# Altium footprint library Connectors_Old.PcbLib: 246 footprints (part 7 of 18)
Each footprint in its own frame and in the unit in brackets; x right, y up, seen from the top. Pads: shape width x height; smd on the part's side, far side on the other; paste and mask are expansions set on the pad; w line width, h text height; cw(c..) or ccw(c..) is an arc to the next point about the centre after c.
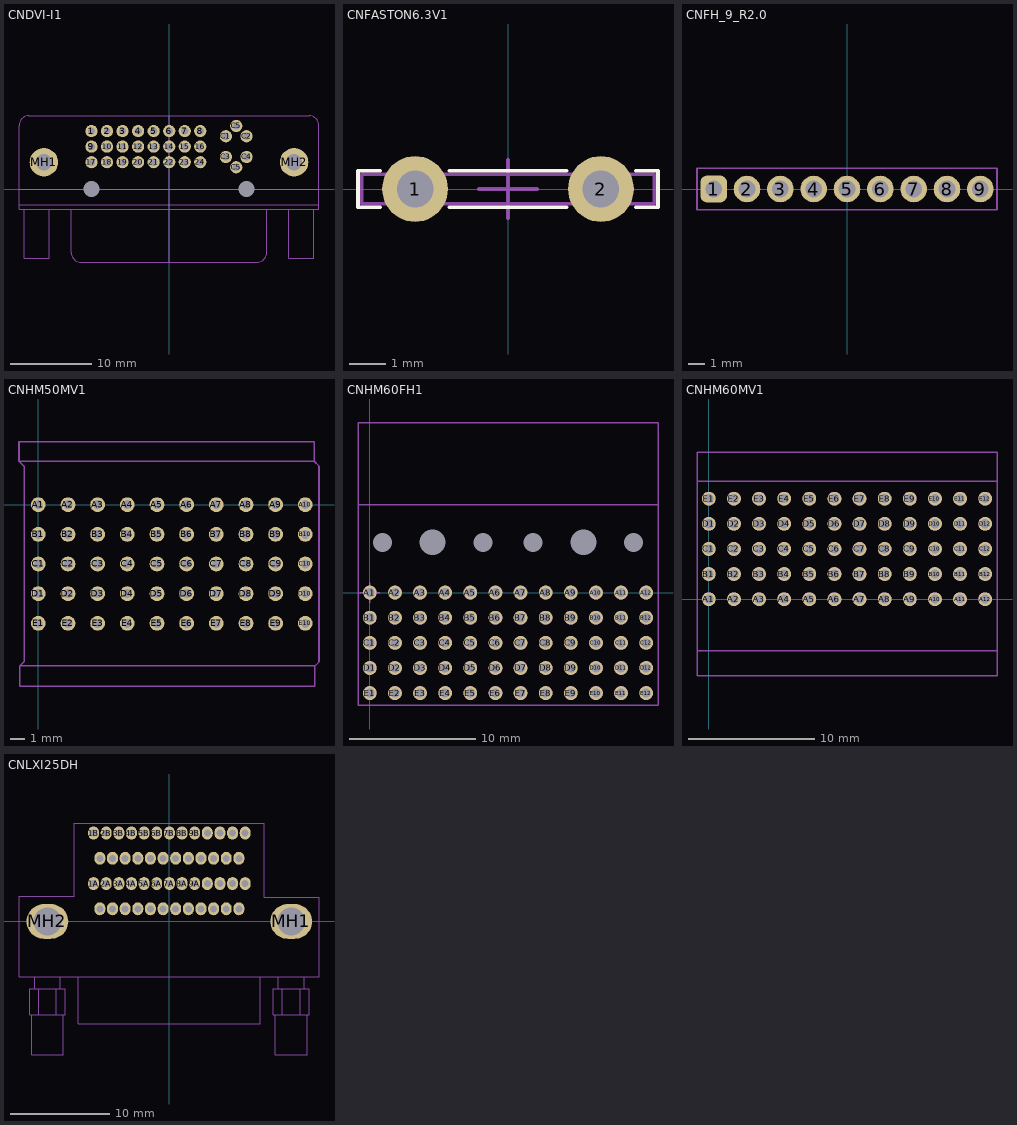
[diagram p6: the footprints below, top view; thin cyan lines are the x and y axes]

## CNDVI-I1 [mm] "DVI-I Analog & Dual link Digital connector R1.91"
height 9.91
pads (34):
  round 1.5 hole 0.9: 1(-9.525,7.12) 2(-7.615,7.12) 3(-5.705,7.12) 4(-3.795,7.12) 5(-1.885,7.12) 6(0.025,7.12) 7(1.935,7.12) 8(3.845,7.12) 9(-9.525,5.21) 10(-7.615,5.21) 11(-5.705,5.21) 12(-3.795,5.21) 13(-1.885,5.21) 14(0.025,5.21) 15(1.935,5.21) 16(3.845,5.21) 17(-9.525,3.3) 18(-7.615,3.3) 19(-5.705,3.3) 20(-3.795,3.3) 21(-1.885,3.3) 22(0.025,3.3) 23(1.935,3.3) 24(3.845,3.3) C1(6.985,6.48) C2(9.525,6.48) C3(6.985,3.94) C4(9.525,3.94) C5(8.255,2.67) C5(8.255,7.75)
  round 3.5 hole 2: MH1(-15.365,3.3) MH2(15.365,3.3)
  round 0 hole 2 unplated mask+1.2: MH3(-9.525,0) MH4(9.525,0)
Mechanical 13:
  lines w0.102: -17.805,-2.51 -17.805,-8.525 -14.705,-8.525 -14.705,-2.51 ; -17.2,9.015 ccw(c-17.2,7.8) -18.415,7.8 -18.415,-2.51 18.415,-2.51 18.415,7.8 ccw(c17.2,7.8) 17.2,9.015 ; -17.2,9.02 17.2,9.02 ; -12.015,-2.525 -12.015,-7.795 ccw(c-10.8,-7.795) -10.8,-9.01 10.8,-9.01 ccw(c10.8,-7.795) 12.015,-7.795 12.015,-2.525 ; 14.705,-2.51 14.705,-8.525 17.805,-8.525 17.805,-2.51
Mechanical 15:
  lines w0.102: -18.425,0 18.425,0 ; -18.415,-1.93 18.415,-1.93 ; 0,-9 0,9
3D body: height 7.24, standoff 3.65, extent -17.996,-8.51 -14.404,-2.51
3D body: height 7.24, standoff 3.65, extent 14.404,-8.51 17.996,-2.51
3D body: height 8.69, standoff 1.2, extent -10.8,-9.01 10.8,-2.51
3D body: height 8.69, standoff 1.2, extent 10.8,-9.031 11.985,-2.51
3D body: height 8.69, standoff 1.2, extent -11.985,-9.031 -10.8,-2.51
3D body: height 8.81, standoff 8.69, extent -12.025,-9.02 12.025,-2.525
3D body: height 1.2, standoff 1.09, extent -12.025,-9.02 12.025,-2.525
3D body: height 9.91, standoff 0.51, extent -18.415,-2.51 18.415,-1.925
3D body: height 9.91, standoff 0, extent -18.425,-1.925 18.425,9.025
3D body: height 0, standoff -3.12, extent 8.08,2.575 8.43,2.75
3D body: height 0, standoff -3.12, extent 9.325,3.845 9.675,4.02
3D body: height 0, standoff -3.12, extent 6.81,3.845 7.16,4.02
3D body: height 0, standoff -3.12, extent 6.81,6.405 7.16,6.58
3D body: height 0, standoff -3.12, extent 9.35,6.385 9.7,6.56
3D body: height 0, standoff -3.12, extent 8.08,7.655 8.43,7.83
3D body: height 0, standoff -3.12, extent -7.79,3.205 -7.44,3.38
3D body: height 0, standoff -3.12, extent -9.7,3.205 -9.35,3.38
3D body: height 0, standoff -3.12, extent -9.7,5.115 -9.35,5.29
3D body: height 0, standoff -3.12, extent -7.79,5.115 -7.44,5.29
3D body: height 0, standoff -3.12, extent -5.88,5.115 -5.53,5.29
3D body: height 0, standoff -3.12, extent -5.88,3.205 -5.53,3.38
3D body: height 0, standoff -3.12, extent -3.97,3.205 -3.62,3.38
3D body: height 0, standoff -3.12, extent -3.97,5.115 -3.62,5.29
3D body: height 0, standoff -3.12, extent -2.06,5.115 -1.71,5.29
3D body: height 0, standoff -3.12, extent -2.06,3.205 -1.71,3.38
3D body: height 0, standoff -3.12, extent -0.15,3.205 0.2,3.38
3D body: height 0, standoff -3.12, extent -0.15,5.115 0.2,5.29
3D body: height 0, standoff -3.12, extent 1.76,5.115 2.11,5.29
3D body: height 0, standoff -3.12, extent 1.76,3.205 2.11,3.38
3D body: height 0, standoff -3.12, extent 3.67,3.205 4.02,3.38
3D body: height 0, standoff -3.12, extent 3.67,5.115 4.02,5.29
3D body: height 0, standoff -3.12, extent 3.67,7.025 4.02,7.2
3D body: height 0, standoff -3.12, extent 1.76,7.025 2.11,7.2
3D body: height 0, standoff -3.12, extent -0.15,7.025 0.2,7.2
3D body: height 0, standoff -3.12, extent -2.06,7.025 -1.71,7.2
3D body: height 0, standoff -3.12, extent -3.97,7.025 -3.62,7.2
3D body: height 0, standoff -3.12, extent -5.88,7.025 -5.53,7.2
3D body: height 0, standoff -3.12, extent -7.79,7.025 -7.44,7.2
3D body: height 0, standoff -3.12, extent -9.7,7.025 -9.35,7.2
3D body: height 0, standoff -2.03, extent -10.534,-1.009 -8.516,1.009
3D body: height 0, standoff -2.03, extent 8.516,-1.009 10.534,1.009
3D body: height 0, standoff -2.79, extent -15.73,2.4 -15.03,4.2
3D body: height 0, standoff -2.79, extent 15,2.4 15.7,4.2
3D body: height 7.64, standoff 6.64, extent -9.95,-9.05 -9.1,-2.51
3D body: height 3.64, standoff 2.64, extent -9.95,-9.05 -9.1,-2.51
3D body: height 5.64, standoff 4.64, extent -9.95,-9.05 -9.1,-2.51
3D body: height 6.64, standoff 5.64, extent 6.56,-9.05 7.41,-1.87
3D body: height 4.64, standoff 3.64, extent 6.56,-9.05 7.41,-1.87
3D body: height 5.24, standoff 4.99, extent 6.375,-9.05 10.125,-7.925
3D body: height 5.64, standoff 4.64, extent -8.04,-9.05 -7.19,-2.51
3D body: height 3.64, standoff 2.64, extent -8.04,-9.05 -7.19,-2.51
3D body: height 7.64, standoff 6.64, extent -8.04,-9.05 -7.19,-2.51
3D body: height 5.64, standoff 4.64, extent -6.13,-9.05 -5.28,-2.51
3D body: height 3.64, standoff 2.64, extent -6.13,-9.05 -5.28,-2.51
3D body: height 7.64, standoff 6.64, extent -6.13,-9.05 -5.28,-2.51
3D body: height 5.64, standoff 4.64, extent -4.22,-9.05 -3.37,-2.51
3D body: height 3.64, standoff 2.64, extent -4.22,-9.05 -3.37,-2.51
3D body: height 7.64, standoff 6.64, extent -4.22,-9.05 -3.37,-2.51
3D body: height 5.64, standoff 4.64, extent -2.31,-9.05 -1.46,-2.51
3D body: height 3.64, standoff 2.64, extent -2.31,-9.05 -1.46,-2.51
3D body: height 7.64, standoff 6.64, extent -2.31,-9.05 -1.46,-2.51
3D body: height 5.64, standoff 4.64, extent -0.4,-9.05 0.45,-2.51
3D body: height 3.64, standoff 2.64, extent -0.4,-9.05 0.45,-2.51
3D body: height 7.64, standoff 6.64, extent -0.4,-9.05 0.45,-2.51
3D body: height 5.64, standoff 4.64, extent 1.51,-9.05 2.36,-2.51
3D body: height 3.64, standoff 2.64, extent 1.51,-9.05 2.36,-2.51
3D body: height 7.64, standoff 6.64, extent 1.51,-9.05 2.36,-2.51
3D body: height 5.64, standoff 4.64, extent 3.42,-9.05 4.27,-2.51
3D body: height 3.64, standoff 2.64, extent 3.42,-9.05 4.27,-2.51
3D body: height 7.64, standoff 6.64, extent 3.42,-9.05 4.27,-2.51
3D body: height 4.64, standoff 3.64, extent 9.075,-9.05 9.925,-1.87
3D body: height 6.64, standoff 5.64, extent 9.075,-9.05 9.925,-1.87

## CNFASTON6.3V1 [mm] "Faston 6.3mm vertical"
height 8
pads (2):
  round 1.8 hole 1: 1(-2.54,0) 2(2.54,0)
Top Overlay:
  lines w0.102: -3.5,-0.5 -4.1,-0.5 -4.1,0.5 -3.5,0.5 ; -1.6,-0.5 1.6,-0.5 ; -1.6,0.5 1.6,0.5 ; 3.5,-0.5 4.1,-0.5 4.1,0.5 3.5,0.5
Mechanical 13:
  lines w0.102: -3.15,-0.4 -3.15,0.4 -4,0.4 ; 3.15,-0.4 3.15,0.4 ; -4,0.4 4,0.4 4,-0.4 -4,-0.4 -4,0.4
Mechanical 15:
  lines w0.102: -0.8,0 0.8,0 ; 0,-0.8 0,0.8
3D body: height 8, standoff 1.5, extent -3.15,-0.4 3.15,0.4
3D body: height 1.5, standoff 0, extent -4,-0.4 4,0.4

## CNFH_9_R2.0 [mm] "Connector Low Profile Female Header, Thru-Hole; 9 pin; Vertical; R2.0 mm"
height 4
pads (9):
  rrect50% 1.6x1.6 hole 1: 1(-8,0)
  round 1.6 hole 1: 2(-6,0) 3(-4,0) 4(-2,0) 5(0,0) 6(2,0) 7(4,0) 8(6,0) 9(8,0)
Mechanical 13:
  lines w0.102: -9,-1.25 -9,1.25 9,1.25 9,-1.25 -9,-1.25
  text "1" at -9.779,-0.762 h1.5
  text "9" at 9.271,-0.762 h1.5
3D body: height 4, standoff 0, extent -9,-1.25 9,1.25
3D body: height 0, standoff -2.7, extent -8.51,-0.51 -7.49,0.51
3D body: height 0, standoff -2.7, extent -6.51,-0.51 -5.49,0.51
3D body: height 0, standoff -2.7, extent -4.51,-0.51 -3.49,0.51
3D body: height 0, standoff -2.7, extent -2.51,-0.51 -1.49,0.51
3D body: height 0, standoff -2.7, extent -0.51,-0.51 0.51,0.51
3D body: height 0, standoff -2.7, extent 1.49,-0.51 2.51,0.51
3D body: height 0, standoff -2.7, extent 3.49,-0.51 4.51,0.51
3D body: height 0, standoff -2.7, extent 5.49,-0.51 6.51,0.51
3D body: height 0, standoff -2.7, extent 7.49,-0.51 8.51,0.51

## CNHM50MV1 [mm] "HM connector R 2mm 50pin for backplane vertical male"
height 13.4
pads (50):
  round 1 hole 0.6: A1(0,0) A2(2,0) A3(4,0) A4(6,0) A5(8,0) A6(10,0) A7(12,0) A8(14,0) A9(16,0) A10(18,0) B1(0,-2) B2(2,-2) B3(4,-2) B4(6,-2) B5(8,-2) B6(10,-2) B7(12,-2) B8(14,-2) B9(16,-2) B10(18,-2) C1(0,-4) C2(2,-4) C3(4,-4) C4(6,-4) C5(8,-4) C6(10,-4) C7(12,-4) C8(14,-4) C9(16,-4) C10(18,-4) D1(0,-6) D2(2,-6) D3(4,-6) D4(6,-6) D5(8,-6) D6(10,-6) D7(12,-6) D8(14,-6) D9(16,-6) D10(18,-6) E1(0,-8) E2(2,-8) E3(4,-8) E4(6,-8) E5(8,-8) E6(10,-8) E7(12,-8) E8(14,-8) E9(16,-8) E10(18,-8)
Mechanical 13:
  drawing of 215 lines, arcs and shapes, not listed
3D body: height 8.2, standoff 0, extent 17.7,-0.3 18.3,0.3
3D body: height 8.2, standoff 0, extent 17.7,-2.3 18.3,-1.7
3D body: height 8.2, standoff 0, extent 17.7,-4.3 18.3,-3.7
3D body: height 8.2, standoff 0, extent 17.7,-6.3 18.3,-5.7
3D body: height 8.2, standoff 0, extent 17.7,-8.3 18.3,-7.7
3D body: height 8.2, standoff 0, extent 15.7,-0.3 16.3,0.3
3D body: height 8.2, standoff 0, extent 15.7,-2.3 16.3,-1.7
3D body: height 8.2, standoff 0, extent 15.7,-4.3 16.3,-3.7
3D body: height 8.2, standoff 0, extent 15.7,-6.3 16.3,-5.7
3D body: height 8.2, standoff 0, extent 15.7,-8.3 16.3,-7.7
3D body: height 8.2, standoff 0, extent 13.7,-0.3 14.3,0.3
3D body: height 8.2, standoff 0, extent 13.7,-2.3 14.3,-1.7
3D body: height 8.2, standoff 0, extent 13.7,-4.3 14.3,-3.7
3D body: height 8.2, standoff 0, extent 13.7,-6.3 14.3,-5.7
3D body: height 8.2, standoff 0, extent 13.7,-8.3 14.3,-7.7
3D body: height 8.2, standoff 0, extent 11.7,-0.3 12.3,0.3
3D body: height 8.2, standoff 0, extent 11.7,-2.3 12.3,-1.7
3D body: height 8.2, standoff 0, extent 11.7,-4.3 12.3,-3.7
3D body: height 8.2, standoff 0, extent 11.7,-6.3 12.3,-5.7
3D body: height 8.2, standoff 0, extent 11.7,-8.3 12.3,-7.7
3D body: height 8.2, standoff 0, extent 9.7,-0.3 10.3,0.3
3D body: height 8.2, standoff 0, extent 9.7,-2.3 10.3,-1.7
3D body: height 8.2, standoff 0, extent 9.7,-4.3 10.3,-3.7
3D body: height 8.2, standoff 0, extent 9.7,-6.3 10.3,-5.7
3D body: height 8.2, standoff 0, extent 9.7,-8.3 10.3,-7.7
3D body: height 8.2, standoff 0, extent 7.7,-0.3 8.3,0.3
3D body: height 8.2, standoff 0, extent 7.7,-2.3 8.3,-1.7
3D body: height 8.2, standoff 0, extent 7.7,-4.3 8.3,-3.7
3D body: height 8.2, standoff 0, extent 7.7,-6.3 8.3,-5.7
3D body: height 8.2, standoff 0, extent 7.7,-8.3 8.3,-7.7
3D body: height 8.2, standoff 0, extent 5.7,-0.3 6.3,0.3
3D body: height 8.2, standoff 0, extent 5.7,-2.3 6.3,-1.7
3D body: height 8.2, standoff 0, extent 5.7,-4.3 6.3,-3.7
3D body: height 8.2, standoff 0, extent 5.7,-6.3 6.3,-5.7
3D body: height 8.2, standoff 0, extent 5.7,-8.3 6.3,-7.7
3D body: height 8.2, standoff 0, extent 3.7,-0.3 4.3,0.3
3D body: height 8.2, standoff 0, extent 3.7,-2.3 4.3,-1.7
3D body: height 8.2, standoff 0, extent 3.7,-4.3 4.3,-3.7
3D body: height 8.2, standoff 0, extent 3.7,-6.3 4.3,-5.7
3D body: height 8.2, standoff 0, extent 3.7,-8.3 4.3,-7.7
3D body: height 8.2, standoff 0, extent 1.7,-0.3 2.3,0.3
3D body: height 8.2, standoff 0, extent 1.7,-2.3 2.3,-1.7
3D body: height 8.2, standoff 0, extent 1.7,-4.3 2.3,-3.7
3D body: height 8.2, standoff 0, extent 1.7,-6.3 2.3,-5.7
3D body: height 8.2, standoff 0, extent 1.7,-8.3 2.3,-7.7
3D body: height 8.2, standoff 0, extent -0.3,-0.3 0.3,0.3
3D body: height 8.2, standoff 0, extent -0.3,-2.3 0.3,-1.7
3D body: height 8.2, standoff 0, extent -0.3,-4.3 0.3,-3.7
3D body: height 8.2, standoff 0, extent -0.3,-6.3 0.3,-5.7
3D body: height 8.2, standoff 0, extent -0.3,-8.3 0.3,-7.7
3D body: height 13.4, standoff 0, extent -1.3,2.925 18.6,4.25
3D body: height 13.4, standoff 0, extent -1.25,-12.25 18.65,-10.875
3D body: height 3, standoff 0, extent -1.3,-10.875 18.925,2.925

## CNHM60FH1 [mm] "HM connector R 2mm 60pin horizontal female 5223008-2"
height 11.3
pads (66):
  round 1.1 hole 0.725: A1(0,0) A2(2,0) A3(4,0) A4(6,0) A5(8,0) A6(10,0) A7(12,0) A8(14,0) A9(16,0) A10(18,0) A11(20,0) A12(22,0) B1(0,-2) B2(2,-2) B3(4,-2) B4(6,-2) B5(8,-2) B6(10,-2) B7(12,-2) B8(14,-2) B9(16,-2) B10(18,-2) B11(20,-2) B12(22,-2) C1(0,-4) C2(2,-4) C3(4,-4) C4(6,-4) C5(8,-4) C6(10,-4) C7(12,-4) C8(14,-4) C9(16,-4) C10(18,-4) C11(20,-4) C12(22,-4) D1(0,-6) D2(2,-6) D3(4,-6) D4(6,-6) D5(8,-6) D6(10,-6) D7(12,-6) D8(14,-6) D9(16,-6) D10(18,-6) D11(20,-6) D12(22,-6) E1(0,-8) E2(2,-8) E3(4,-8) E4(6,-8) E5(8,-8) E6(10,-8) E7(12,-8) E8(14,-8) E9(16,-8) E10(18,-8) E11(20,-8) E12(22,-8)
  round 0 hole 1.5 unplated mask+0.9: MH1(1,4) MH3(9,4) MH4(13,4) MH7(21,4)
  round 0 hole 2.05 unplated mask+1.15: MH2(5,4) MH6(17,4)
Mechanical 13:
  lines w0.102: -0.94,-8.95 22.94,-8.95 22.94,13.5 -0.94,13.5 -0.94,-8.95
Mechanical 15:
  lines w0.102: -0.9,7 22.9,7 ; -0.8,0 0.8,0 ; 0,-0.8 0,0.8
Mechanical 17:
  circle w1.1: c0,0 r0.001
  circle w1.1: c2,0 r0.001
  circle w1.1: c0,-2 r0.001
  circle w1.1: c4,0 r0.001
  circle w1.1: c6,0 r0.001
  circle w1.1: c8,0 r0.001
  circle w1.1: c10,0 r0.001
  circle w1.1: c12,0 r0.001
  circle w1.1: c14,0 r0.001
  circle w1.1: c16,0 r0.001
  circle w1.1: c18,0 r0.001
  circle w1.1: c20,0 r0.001
  circle w1.1: c22,0 r0.001
  circle w1.1: c22,-2 r0.001
  circle w1.1: c20,-2 r0.001
  circle w1.1: c18,-2 r0.001
  circle w1.1: c16,-2 r0.001
  circle w1.1: c14,-2 r0.001
  circle w1.1: c12,-2 r0.001
  circle w1.1: c10,-2 r0.001
  circle w1.1: c8,-2 r0.001
  circle w1.1: c6,-2 r0.001
  circle w1.1: c4,-2 r0.001
  circle w1.1: c2,-2 r0.001
  circle w1.1: c2,-4 r0.001
  circle w1.1: c4,-4 r0.001
  circle w1.1: c6,-4 r0.001
  circle w1.1: c8,-4 r0.001
  circle w1.1: c10,-4 r0.001
  circle w1.1: c12,-4 r0.001
  circle w1.1: c14,-4 r0.001
  circle w1.1: c16,-4 r0.001
  circle w1.1: c18,-4 r0.001
  circle w1.1: c20,-4 r0.001
  circle w1.1: c22,-4 r0.001
  circle w1.1: c0,-4 r0.001
  circle w1.1: c2,-6 r0.001
  circle w1.1: c4,-6 r0.001
  circle w1.1: c6,-6 r0.001
  circle w1.1: c8,-6 r0.001
  circle w1.1: c10,-6 r0.001
  circle w1.1: c12,-6 r0.001
  circle w1.1: c14,-6 r0.001
  circle w1.1: c16,-6 r0.001
  circle w1.1: c18,-6 r0.001
  circle w1.1: c20,-6 r0.001
  circle w1.1: c22,-6 r0.001
  circle w1.1: c0,-6 r0.001
  circle w1.1: c2,-8 r0.001
  circle w1.1: c4,-8 r0.001
  circle w1.1: c6,-8 r0.001
  circle w1.1: c8,-8 r0.001
  circle w1.1: c10,-8 r0.001
  circle w1.1: c12,-8 r0.001
  circle w1.1: c14,-8 r0.001
  circle w1.1: c16,-8 r0.001
  circle w1.1: c18,-8 r0.001
  circle w1.1: c20,-8 r0.001
  circle w1.1: c22,-8 r0.001
  circle w1.1: c0,-8 r0.001
  text "Drilled hole: 0.835 ± 0.025 mm" at -0.889,9.652 h2.5
  text "Finished hole: 0.725 ± 0.075 mm" at -0.889,7.493 h2.5

## CNHM60MV1 [mm] "HM connector R 2mm 60pin vertical male 5223016-2"
height 13.4
pads (60):
  round 1.1 hole 0.725: A1(0,0) A2(2,0) A3(4,0) A4(6,0) A5(8,0) A6(10,0) A7(12,0) A8(14,0) A9(16,0) A10(18,0) A11(20,0) A12(22,0) B1(0,2) B2(2,2) B3(4,2) B4(6,2) B5(8,2) B6(10,2) B7(12,2) B8(14,2) B9(16,2) B10(18,2) B11(20,2) B12(22,2) C1(0,4) C2(2,4) C3(4,4) C4(6,4) C5(8,4) C6(10,4) C7(12,4) C8(14,4) C9(16,4) C10(18,4) C11(20,4) C12(22,4) D1(0,6) D2(2,6) D3(4,6) D4(6,6) D5(8,6) D6(10,6) D7(12,6) D8(14,6) D9(16,6) D10(18,6) D11(20,6) D12(22,6) E1(0,8) E2(2,8) E3(4,8) E4(6,8) E5(8,8) E6(10,8) E7(12,8) E8(14,8) E9(16,8) E10(18,8) E11(20,8) E12(22,8)
Mechanical 13:
  drawing of 246 lines, arcs and shapes, not listed
Mechanical 17:
  circle w1.1: c0,0 r0.001
  circle w1.1: c22,0 r0.001
  circle w1.1: c20,0 r0.001
  circle w1.1: c18,0 r0.001
  circle w1.1: c16,0 r0.001
  circle w1.1: c14,0 r0.001
  circle w1.1: c12,0 r0.001
  circle w1.1: c10,0 r0.001
  circle w1.1: c8,0 r0.001
  circle w1.1: c6,0 r0.001
  circle w1.1: c4,0 r0.001
  circle w1.1: c2,0 r0.001
  circle w1.1: c0,2 r0.001
  circle w1.1: c22,2 r0.001
  circle w1.1: c20,2 r0.001
  circle w1.1: c18,2 r0.001
  circle w1.1: c16,2 r0.001
  circle w1.1: c14,2 r0.001
  circle w1.1: c12,2 r0.001
  circle w1.1: c10,2 r0.001
  circle w1.1: c8,2 r0.001
  circle w1.1: c6,2 r0.001
  circle w1.1: c4,2 r0.001
  circle w1.1: c2,2 r0.001
  circle w1.1: c0,4 r0.001
  circle w1.1: c22,4 r0.001
  circle w1.1: c20,4 r0.001
  circle w1.1: c18,4 r0.001
  circle w1.1: c16,4 r0.001
  circle w1.1: c14,4 r0.001
  circle w1.1: c12,4 r0.001
  circle w1.1: c10,4 r0.001
  circle w1.1: c8,4 r0.001
  circle w1.1: c6,4 r0.001
  circle w1.1: c4,4 r0.001
  circle w1.1: c2,4 r0.001
  circle w1.1: c2,6 r0.001
  circle w1.1: c4,6 r0.001
  circle w1.1: c6,6 r0.001
  circle w1.1: c8,6 r0.001
  circle w1.1: c10,6 r0.001
  circle w1.1: c12,6 r0.001
  circle w1.1: c14,6 r0.001
  circle w1.1: c16,6 r0.001
  circle w1.1: c18,6 r0.001
  circle w1.1: c20,6 r0.001
  circle w1.1: c22,6 r0.001
  circle w1.1: c22,8 r0.001
  circle w1.1: c20,8 r0.001
  circle w1.1: c18,8 r0.001
  circle w1.1: c16,8 r0.001
  circle w1.1: c14,8 r0.001
  circle w1.1: c12,8 r0.001
  circle w1.1: c10,8 r0.001
  circle w1.1: c8,8 r0.001
  circle w1.1: c6,8 r0.001
  circle w1.1: c4,8 r0.001
  circle w1.1: c0,6 r0.001
  circle w1.1: c2,8 r0.001
  circle w1.1: c0,8 r0.001
  text "Finished hole: 0.725 ± 0.075 mm" at -0.508,9.525 h2.5
  text "Drilled hole: 0.835 ± 0.025 mm" at -0.508,11.684 h2.5
3D body: height 17, standoff 3.4, extent -0.94,-6.1 22.94,-4.1
3D body: height 17, standoff 3.4, extent -0.94,9.4 22.94,11.7
3D body: height 3.4, standoff 0, extent -0.94,-6.1 22.94,11.7
3D body: height 9.15, standoff -4.25, extent 19.7,7.7 20.3,8.3
3D body: height 9.15, standoff -4.25, extent 19.7,5.7 20.3,6.3
3D body: height 9.15, standoff -4.25, extent 19.7,3.7 20.3,4.3
3D body: height 9.15, standoff -4.25, extent 19.7,1.7 20.3,2.3
3D body: height 9.15, standoff -4.25, extent 19.7,-0.3 20.3,0.3
3D body: height 9.15, standoff -4.25, extent 21.7,7.7 22.3,8.3
3D body: height 9.15, standoff -4.25, extent 21.7,5.7 22.3,6.3
3D body: height 9.15, standoff -4.25, extent 21.7,3.7 22.3,4.3
3D body: height 9.15, standoff -4.25, extent 21.7,1.7 22.3,2.3
3D body: height 9.15, standoff -4.25, extent 21.7,-0.3 22.3,0.3
3D body: height 9.15, standoff -4.25, extent 17.7,-0.3 18.3,0.3
3D body: height 9.15, standoff -4.25, extent 17.7,1.7 18.3,2.3
3D body: height 9.15, standoff -4.25, extent 17.7,3.7 18.3,4.3
3D body: height 9.15, standoff -4.25, extent 17.7,5.7 18.3,6.3
3D body: height 9.15, standoff -4.25, extent 17.7,7.7 18.3,8.3
3D body: height 9.15, standoff -4.25, extent 15.7,-0.3 16.3,0.3
3D body: height 9.15, standoff -4.25, extent 15.7,1.7 16.3,2.3
3D body: height 9.15, standoff -4.25, extent 15.7,3.7 16.3,4.3
3D body: height 9.15, standoff -4.25, extent 15.7,5.7 16.3,6.3
3D body: height 9.15, standoff -4.25, extent 15.7,7.7 16.3,8.3
3D body: height 9.15, standoff -4.25, extent 13.7,-0.3 14.3,0.3
3D body: height 9.15, standoff -4.25, extent 13.7,1.7 14.3,2.3
3D body: height 9.15, standoff -4.25, extent 13.7,3.7 14.3,4.3
3D body: height 9.15, standoff -4.25, extent 13.7,5.7 14.3,6.3
3D body: height 9.15, standoff -4.25, extent 13.7,7.7 14.3,8.3
3D body: height 9.15, standoff -4.25, extent 11.7,-0.3 12.3,0.3
3D body: height 9.15, standoff -4.25, extent 11.7,1.7 12.3,2.3
3D body: height 9.15, standoff -4.25, extent 11.7,3.7 12.3,4.3
3D body: height 9.15, standoff -4.25, extent 11.7,5.7 12.3,6.3
3D body: height 9.15, standoff -4.25, extent 11.7,7.7 12.3,8.3
3D body: height 9.15, standoff -4.25, extent 9.7,-0.3 10.3,0.3
3D body: height 9.15, standoff -4.25, extent 9.7,1.7 10.3,2.3
3D body: height 9.15, standoff -4.25, extent 9.7,3.7 10.3,4.3
3D body: height 9.15, standoff -4.25, extent 9.7,5.7 10.3,6.3
3D body: height 9.15, standoff -4.25, extent 9.7,7.7 10.3,8.3
3D body: height 9.15, standoff -4.25, extent 7.7,-0.3 8.3,0.3
3D body: height 9.15, standoff -4.25, extent 7.7,1.7 8.3,2.3
3D body: height 9.15, standoff -4.25, extent 7.7,3.7 8.3,4.3
3D body: height 9.15, standoff -4.25, extent 7.7,5.7 8.3,6.3
3D body: height 9.15, standoff -4.25, extent 7.7,7.7 8.3,8.3
3D body: height 9.15, standoff -4.25, extent 5.7,-0.3 6.3,0.3
3D body: height 9.15, standoff -4.25, extent 5.7,1.7 6.3,2.3
3D body: height 9.15, standoff -4.25, extent 5.7,3.7 6.3,4.3
3D body: height 9.15, standoff -4.25, extent 5.7,5.7 6.3,6.3
3D body: height 9.15, standoff -4.25, extent 5.7,7.7 6.3,8.3
3D body: height 9.15, standoff -4.25, extent 3.7,-0.3 4.3,0.3
3D body: height 9.15, standoff -4.25, extent 3.7,1.7 4.3,2.3
3D body: height 9.15, standoff -4.25, extent 3.7,3.7 4.3,4.3
3D body: height 9.15, standoff -4.25, extent 3.7,5.7 4.3,6.3
3D body: height 9.15, standoff -4.25, extent 3.7,7.7 4.3,8.3
3D body: height 9.15, standoff -4.25, extent 1.7,-0.3 2.3,0.3
3D body: height 9.15, standoff -4.25, extent 1.7,1.7 2.3,2.3
3D body: height 9.15, standoff -4.25, extent 1.7,3.7 2.3,4.3
3D body: height 9.15, standoff -4.25, extent 1.7,5.7 2.3,6.3
3D body: height 9.15, standoff -4.25, extent 1.7,7.7 2.3,8.3
3D body: height 9.15, standoff -4.25, extent -0.3,-0.3 0.3,0.3
3D body: height 9.15, standoff -4.25, extent -0.3,1.7 0.3,2.3
3D body: height 9.15, standoff -4.25, extent -0.3,3.7 0.3,4.3
3D body: height 9.15, standoff -4.25, extent -0.3,5.7 0.3,6.3
3D body: height 9.15, standoff -4.25, extent -0.3,7.7 0.3,8.3

## CNLXI25DH [mm] "Connector LXI Horizontal, THDM; 25 pin; R1.27 mm; Body 30.1 x 20.13 x 18.67 mm (LxWxH)"
height 18.67
pads (52):
  oval 1.1x1.3 / inner round 1.1 / far side oval 1.1x1.3 hole 0.7 mask+0.051: 1A(-7.62,3.81) 1B(-7.62,8.89) 2A(-6.35,3.81) 2B(-6.35,8.89) 3A(-5.08,3.81) 3B(-5.08,8.89) 4A(-3.81,3.81) 4B(-3.81,8.89) 5A(-2.54,3.81) 5B(-2.54,8.89) 6A(-1.27,3.81) 6B(-1.27,8.89) 7A(0,3.81) 7B(0,8.89) 8A(1.27,3.81) 8B(1.27,8.89) 9A(2.54,3.81) 9B(2.54,8.89) 10A(3.81,3.81) 10B(3.81,8.89) 11A(5.08,3.81) 11B(5.08,8.89) 12A(6.35,3.81) 12B(6.35,8.89) 13A(7.62,3.81) 13B(7.62,8.89) 14A(-6.985,1.27) 14B(-6.985,6.35) 15A(-5.715,1.27) 15B(-5.715,6.35) 16A(-4.445,1.27) 16B(-4.445,6.35) 17A(-3.175,1.27) 17B(-3.175,6.35) 18A(-1.905,1.27) 18B(-1.905,6.35) 19A(-0.635,1.27) 19B(-0.635,6.35) 20A(0.635,1.27) 20B(0.635,6.35) 21A(1.905,1.27) 21B(1.905,6.35) 22A(3.175,1.27) 22B(3.175,6.35) 23A(4.445,1.27) 23B(4.445,6.35) 24A(5.715,1.27) 24B(5.715,6.35) 25A(6.985,1.27) 25B(6.985,6.35)
  oval 4.2x3.5 hole 2.8: MH1(12.255,0) MH2(-12.255,0)
Mechanical 13:
  lines w0.102: -13.847,-9.372 -13.847,-13.372 -10.647,-13.372 -10.647,-9.372 ; -13.547,-6.772 -13.547,-5.572 ; -13.147,-9.372 -13.147,-6.772 ; -11.347,-9.372 -11.347,-6.772 ; -10.947,-6.772 -10.947,-5.572 ; -9.144,-5.572 -9.144,-10.297 9.144,-10.297 9.144,-5.572 ; 10.653,-9.372 10.653,-13.372 13.853,-13.372 13.853,-9.372 ; 10.953,-6.772 10.953,-5.572 ; 11.353,-9.372 11.353,-6.772 ; 13.153,-9.372 13.153,-6.772 ; 13.553,-6.772 13.553,-5.572 ; -15.113,-5.572 -15.113,2.54 -9.574,2.54 -9.574,9.845 9.552,9.845 9.552,2.413 15.038,2.413 15.038,-5.572 -15.113,-5.572 ; -14.047,-9.372 -10.447,-9.372 -10.447,-6.772 -14.047,-6.772 -14.047,-9.372 ; 10.453,-9.372 14.053,-9.372 14.053,-6.772 10.453,-6.772 10.453,-9.372
3D body: height 5.1, standoff 2.51, extent 10.953,-6.772 13.547,-5.59
3D body: height 5.6, standoff 2.01, extent 10.453,-9.372 14.045,-6.772
3D body: height 5.4, standoff 2.21, extent 10.653,-13.372 13.846,-9.372
3D body: height 5.1, standoff 2.51, extent -13.547,-6.772 -10.953,-5.59
3D body: height 5.6, standoff 2.01, extent -14.047,-9.372 -10.455,-6.772
3D body: height 5.4, standoff 2.21, extent -13.847,-13.372 -10.654,-9.372
3D body: height 16.15, standoff 13.56, extent 10.953,-6.772 13.547,-5.59
3D body: height 16.64, standoff 13.06, extent 10.453,-9.372 14.045,-6.772
3D body: height 16.45, standoff 13.26, extent 10.653,-13.372 13.846,-9.372
3D body: height 16.45, standoff 13.26, extent -13.847,-13.372 -10.654,-9.372
3D body: height 16.64, standoff 13.06, extent -14.047,-9.372 -10.455,-6.772
3D body: height 16.15, standoff 13.56, extent -13.547,-6.772 -10.953,-5.59
3D body: height 6.01, standoff 1.61, extent -8.509,-10.447 8.509,-10.147
3D body: height 17.06, standoff 12.66, extent -8.509,-10.447 8.509,-10.147
3D body: height 7.11, standoff 0.51, extent -9.144,-10.297 9.144,-5.572
3D body: height 18.16, standoff 11.56, extent -9.144,-10.297 9.144,-5.572
3D body: height 18.67, standoff 0, extent -15.113,-5.588 15.037,-5.207
3D body: height 18.67, standoff 0, extent -15.113,-5.207 15.038,9.845
3D body: height 0, standoff -2.79, extent -13.652,-1.409 -10.859,1.409
3D body: height 0, standoff -2.79, extent 10.858,-1.409 13.651,1.409
3D body: height 0, standoff -2.79, extent -7.983,8.527 -7.257,9.253
3D body: height 0, standoff -2.79, extent -6.713,8.527 -5.987,9.253
3D body: height 0, standoff -2.79, extent -5.443,8.527 -4.717,9.253
3D body: height 0, standoff -2.79, extent -4.173,8.527 -3.447,9.253
3D body: height 0, standoff -2.79, extent -2.903,8.527 -2.177,9.253
3D body: height 0, standoff -2.79, extent -1.633,8.527 -0.907,9.253
3D body: height 0, standoff -2.79, extent -0.363,8.527 0.363,9.253
3D body: height 0, standoff -2.79, extent 0.907,8.527 1.633,9.253
3D body: height 0, standoff -2.79, extent 2.177,8.527 2.903,9.253
3D body: height 0, standoff -2.79, extent 3.447,8.527 4.173,9.253
3D body: height 0, standoff -2.79, extent 4.717,8.527 5.443,9.253
3D body: height 0, standoff -2.79, extent 5.987,8.527 6.713,9.253
3D body: height 0, standoff -2.79, extent 7.257,8.527 7.983,9.253
3D body: height 0, standoff -2.79, extent 6.622,5.987 7.348,6.713
3D body: height 0, standoff -2.79, extent 5.352,5.987 6.078,6.713
3D body: height 0, standoff -2.79, extent 4.082,5.987 4.808,6.713
3D body: height 0, standoff -2.79, extent 2.812,5.987 3.538,6.713
3D body: height 0, standoff -2.79, extent 1.542,5.987 2.268,6.713
3D body: height 0, standoff -2.79, extent 0.272,5.987 0.998,6.713
3D body: height 0, standoff -2.79, extent -0.998,5.987 -0.272,6.713
3D body: height 0, standoff -2.79, extent -2.268,5.987 -1.542,6.713
3D body: height 0, standoff -2.79, extent -3.538,5.987 -2.812,6.713
3D body: height 0, standoff -2.79, extent -4.808,5.987 -4.082,6.713
3D body: height 0, standoff -2.79, extent -6.078,5.987 -5.352,6.713
3D body: height 0, standoff -2.79, extent -7.348,5.987 -6.622,6.713
3D body: height 0, standoff -2.79, extent -7.983,3.447 -7.257,4.173
3D body: height 0, standoff -2.79, extent -6.713,3.447 -5.987,4.173
3D body: height 0, standoff -2.79, extent -5.443,3.447 -4.717,4.173
3D body: height 0, standoff -2.79, extent -4.173,3.447 -3.447,4.173
3D body: height 0, standoff -2.79, extent -2.903,3.447 -2.177,4.173
3D body: height 0, standoff -2.79, extent -1.633,3.447 -0.907,4.173
3D body: height 0, standoff -2.79, extent -0.363,3.447 0.363,4.173
3D body: height 0, standoff -2.79, extent 0.907,3.447 1.633,4.173
3D body: height 0, standoff -2.79, extent 2.177,3.447 2.903,4.173
3D body: height 0, standoff -2.79, extent 3.447,3.447 4.173,4.173
3D body: height 0, standoff -2.79, extent 4.717,3.447 5.443,4.173
3D body: height 0, standoff -2.79, extent -7.348,0.907 -6.622,1.633
3D body: height 0, standoff -2.79, extent -6.078,0.907 -5.352,1.633
3D body: height 0, standoff -2.79, extent -4.808,0.907 -4.082,1.633
3D body: height 0, standoff -2.79, extent -3.538,0.907 -2.812,1.633
3D body: height 0, standoff -2.79, extent -2.268,0.907 -1.542,1.633
3D body: height 0, standoff -2.79, extent -0.998,0.907 -0.272,1.633
3D body: height 0, standoff -2.79, extent 0.272,0.907 0.998,1.633
3D body: height 0, standoff -2.79, extent 1.542,0.907 2.268,1.633
3D body: height 0, standoff -2.79, extent 2.812,0.907 3.538,1.633
3D body: height 0, standoff -2.79, extent 4.082,0.907 4.808,1.633
3D body: height 0, standoff -2.79, extent 5.987,3.447 6.713,4.173
3D body: height 0, standoff -2.79, extent 7.257,3.447 7.983,4.173
3D body: height 0, standoff -2.79, extent 5.352,0.907 6.078,1.633
3D body: height 0, standoff -2.79, extent 6.622,0.907 7.348,1.633